# Altium footprint library InverterPCBLib.PcbLib: 74 footprints (part 3 of 5)
Each footprint in its own frame and in the unit in brackets; x right, y up, seen from the top. Pads: shape width x height; smd on the part's side, far side on the other; paste and mask are expansions set on the pad; w line width, h text height; cw(c..) or ccw(c..) is an arc to the next point about the centre after c.
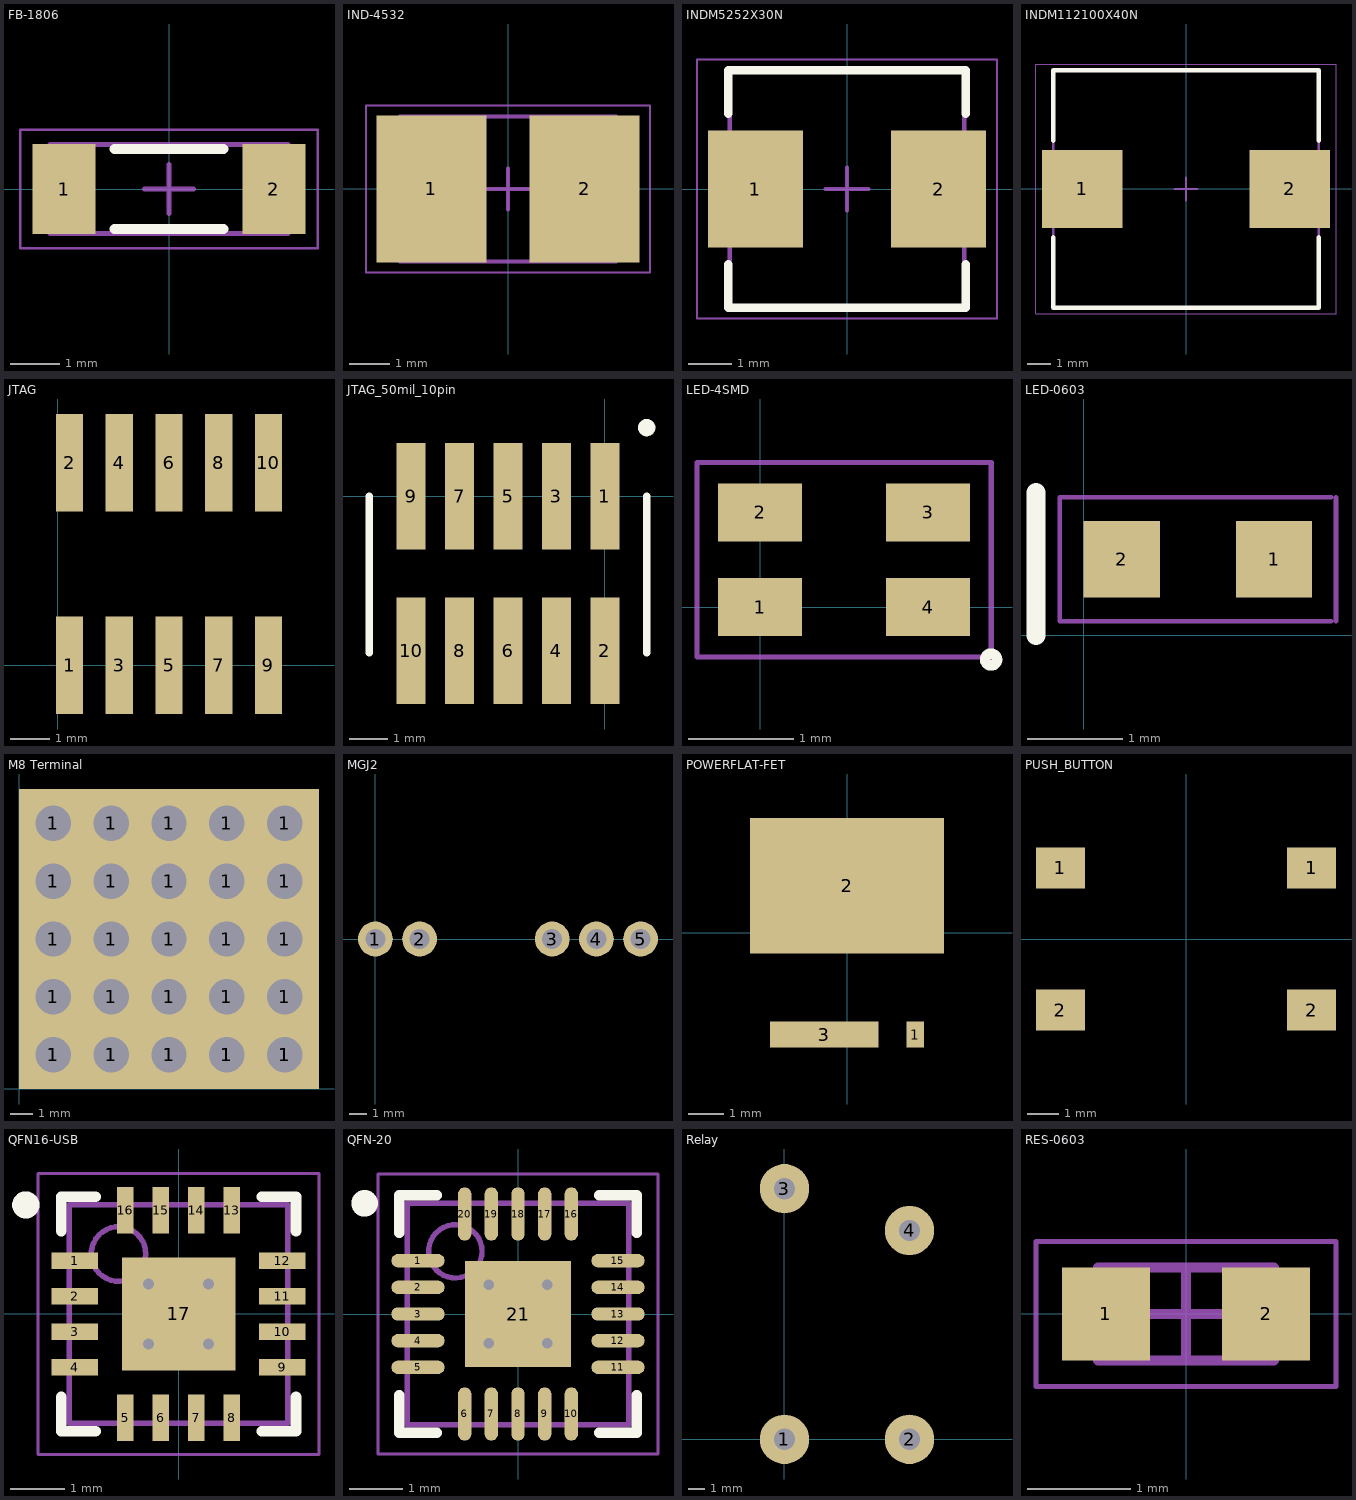
[diagram p2: the footprints below, top view; thin cyan lines are the x and y axes]

## FB-1806 [mm] "Chip Inductor, 2-Leads, Body 4.50x1.60mm, IPC Medium Density"
height 1.3
pads (2):
  rect 1.27x1.82 smd: 1(-2.12,0) 2(2.12,0)
Top Overlay:
  lines w0.2: -1.1,-0.81 1.1,-0.81 ; -1.1,0.81 1.1,0.81
Mechanical 13:
  lines w0.1: -2.4,-0.9 -2.4,0.9 2.4,0.9 2.4,-0.9 -2.4,-0.9
Mechanical 15:
  lines w0.05: -3,-1.2 -3,1.2 3,1.2 3,-1.2 -3,-1.2
  lines w0.1: -0.5,0 0.5,0 ; 0,-0.5 0,0.5
3D body "INDC4516X13N.step": height 1.3, standoff 0, extent -2.4,-0.9 2.4,0.9

## IND-4532 [mm] "Precision Wire Wound Inductor, 2-Leads, Body 5.05x3.50mm, IPC Medium Density"
height 2.6
pads (2):
  rect 2.7x3.6 smd: 1(-1.875,0) 2(1.875,0)
Mechanical 13:
  lines w0.1: -2.65,-1.775 -2.65,1.775 2.65,1.775 2.65,-1.775 -2.65,-1.775
Mechanical 15:
  lines w0.05: -3.475,-2.05 -3.475,2.05 3.475,2.05 3.475,-2.05 -3.475,-2.05
  lines w0.1: -0.5,0 0.5,0 ; 0,-0.5 0,0.5
3D body "INDP5035X26N.step": height 2.7, standoff 0, extent -2.625,-1.75 2.625,1.75

## INDM5252X30N [mm] "Molded Inductor, 2-Leads, Body 5.19x5.19mm, IPC Medium Density"
height 3
pads (2):
  rect 2.2x2.7 smd: 1(-2.125,0) 2(2.125,0)
Top Overlay:
  lines w0.2: -2.75,-1.75 -2.75,-2.75 2.75,-2.75 2.75,-1.75 ; -2.75,1.75 -2.75,2.75 2.75,2.75 2.75,1.75
Mechanical 13:
  lines w0.1: -2.715,-2.715 2.715,-2.715 2.715,2.715 -2.715,2.715 -2.715,-2.715
Mechanical 15:
  lines w0.05: -3.475,-3 3.475,-3 3.475,3 -3.475,3 -3.475,-3
  lines w0.1: -0.5,0 0.5,0 ; 0,-0.5 0,0.5
3D body "INDM5252X30N.step": height 3, standoff 0, extent -2.935,-2.715 2.935,2.715

## INDM112100X40N [mm] "Molded Inductor, 2-Leads, Body 11.15x10.00mm, IPC Medium Density"
height 4
pads (2):
  rect 3.5x3.4 smd: 1(-4.5,0) 2(4.5,0)
Top Overlay:
  lines w0.2: -5.75,-2.1 -5.75,-5.15 5.75,-5.15 5.75,-2.1 ; -5.75,2.1 -5.75,5.15 5.75,5.15 5.75,2.1
Mechanical 13:
  lines w0.1: -5.75,-5.15 5.75,-5.15 5.75,5.15 -5.75,5.15 -5.75,-5.15
Mechanical 15:
  lines w0.05: -6.5,-5.4 6.5,-5.4 6.5,5.4 -6.5,5.4 -6.5,-5.4
  lines w0.1: -0.5,0 0.5,0 ; 0,-0.5 0,0.5
3D body "INDM112100X40N.step": height 4, standoff 0, extent -5.97,-5.15 5.97,5.15

## JTAG [mm]
pads (10):
  rect 0.7x2.5 smd: 1(0.3,0) 2(0.3,5.205) 3(1.577,0) 4(1.577,5.205) 5(2.855,0) 6(2.855,5.205) 7(4.132,0) 8(4.132,5.205) 9(5.41,0) 10(5.41,5.205)
3D body "FTSH-105-01-F-DV-K-TR--3DModel-STEP-56544.STEP": height 6.11, standoff -0.01, extent -0.31,-0.321 6.04,5.521

## JTAG_50mil_10pin [mil]
pads (10):
  rect 30x110 smd: 1(0,0) 2(0,-159.84) 3(-50,0) 4(-50,-159.84) 5(-100,0) 6(-100,-159.84) 7(-150,0) 8(-150,-159.84) 9(-200,0) 10(-200,-159.84)
Top Overlay:
  circle w10: c43.31,70.87 r3.94
  lines w7.87: -243.31,-161.42 -243.31,0 ; 43.31,-161.42 43.31,0
3D body "FTSH-105-01-L-DV-K-TR.stp": height 240.75, standoff -0.25, extent -223.42,-193.74 26.57,36.26

## LED-4SMD [mm]
pads (4):
  rect 0.8x0.55 smd: 1(0,0) 2(0,0.9) 3(1.6,0.9) 4(1.6,0)
Top Overlay:
  circle w0.1: c2.2,-0.5 r0.056
Mechanical 15:
  lines w0.05: -0.6,-0.475 2.2,-0.475 2.2,1.375 -0.6,1.375 -0.6,-0.475
3D body "150060AS75000_STP_150060xS75000_rev1.stp": height 0.7, standoff 0, extent 0,0.375 1.6,1.175
3D body "150060AS75000_STP_150060xS75000_rev1.stp": height 0.7, standoff 0, extent 0,-0.25 1.6,0.55

## LED-0603 [mm]
pads (2):
  rect 0.8x0.8 smd: 1(2,0.8) 2(0.4,0.8)
Top Overlay:
  lines w0.2: -0.5,0 -0.5,1.5
Mechanical 15:
  lines w0.05: 2.6,0.15 -0.25,0.15 -0.25,1.45 2.6,1.45 ; 2.65,0.15 2.65,1.45
3D body "150060AS75000_STP_150060xS75000_rev1.stp": height 0.7, standoff 0, extent 0.4,0.4 2,1.2

## M8 Terminal [mm]
pads (30):
  rect 3x3 hole 1.55 square unplated: 1(1.5,1.5) 1(1.5,1.5) 1(1.5,4.04) 1(1.5,6.58) 1(1.5,9.12) 1(1.5,11.66) 1(4.04,1.5) 1(4.04,1.5) 1(4.04,4.04) 1(4.04,6.58) 1(4.04,9.12) 1(4.04,11.66) 1(6.58,1.5) 1(6.58,1.5) 1(6.58,4.04) 1(6.58,6.58) 1(6.58,9.12) 1(6.58,11.66) 1(9.12,1.5) 1(9.12,1.5) 1(9.12,4.04) 1(9.12,6.58) 1(9.12,9.12) 1(9.12,11.66) 1(11.66,1.5) 1(11.66,1.5) 1(11.66,4.04) 1(11.66,6.58) 1(11.66,9.12) 1(11.66,11.66)
3D body "M8_ScrewTerminal.STEP": height 53, standoff -3.5, extent 0.075,0.075 13.075,13.075

## MGJ2 [mm]
pads (5):
  round 2 hole 1.15 unplated: 1(0,0) 2(2.54,0) 3(10.16,0) 4(12.7,0) 5(15.24,0)
3D body "mps_dcdc_mgj2d_sc_a.step": height 12.6, standoff -4, extent -2.28,-7.32 17.22,2.5

## POWERFLAT-FET [mm]
pads (3):
  rect 0.5x0.73 smd: 1(1.905,-2.835)
  rect 5.4x3.77 smd: 2(0,1.315)
  rect 3.04x0.73 smd: 3(-0.635,-2.835)
3D body: height 1, standoff 0, extent -2.575,-3.075 2.575,3.05

## PUSH_BUTTON [mm]
pads (4):
  rect 1.55x1.3 smd: 1(-3.975,2.25) 1(3.975,2.25) 2(-3.975,-2.25) 2(3.975,-2.25)
3D body "push button.stp": height 4.3, standoff 0, extent -4.5,-3 4.5,3

## QFN16-USB [mm] "QFN, 16-Leads, Body 4.00x4.00mm, Pitch 0.65mm, Thermal Pad 2.08x2.08mm, IPC Medium Density"
height 0.8
pads (17):
  rect 0.85x0.3 smd: 1(-1.9,0.975) 2(-1.9,0.325) 3(-1.9,-0.325) 4(-1.9,-0.975) 9(1.9,-0.975) 10(1.9,-0.325) 11(1.9,0.325) 12(1.9,0.975)
  rect 0.3x0.85 smd: 5(-0.975,-1.9) 6(-0.325,-1.9) 7(0.325,-1.9) 8(0.975,-1.9) 13(0.975,1.9) 14(0.325,1.9) 15(-0.325,1.9) 16(-0.975,1.9)
  rect 2.08x2.08 smd: 17(0,0)
via -0.55,0.55 diameter 0.5 hole 0.2
via 0.55,0.55 diameter 0.5 hole 0.2
via -0.55,-0.55 diameter 0.5 hole 0.2
via 0.55,-0.55 diameter 0.5 hole 0.2
Top Overlay:
  circle w0.25: c-2.8,2 r0.125
  lines w0.2: -2.15,-1.525 -2.15,-2.15 -1.525,-2.15 ; -2.15,1.525 -2.15,2.15 -1.525,2.15 ; 1.525,-2.15 2.15,-2.15 2.15,-1.525 ; 1.525,2.15 2.15,2.15 2.15,1.525
Mechanical 13:
  circle w0.1: c-1.1,1.1 r0.5
  lines w0.1: -2,-2 -2,2 2,2 2,-2 -2,-2
Mechanical 15:
  lines w0.05: -2.575,-2.575 -2.575,2.575 2.575,2.575 2.575,-2.575 -2.575,-2.575
  lines w0.1: -0.5,0 0.5,0 ; 0,-0.5 0,0.5
3D body "QFN65P400X400X80_HS-17N.step": height 0.8, standoff 0, extent -2.05,-2.05 2.05,2.05

## QFN-20 [mm] "QFN, 20-Leads, Body 4.00x4.00mm, Pitch 0.50mm, Thermal Pad 1.98x1.98mm, IPC Medium Density"
height 0.8
pads (21):
  oval 1x0.25 smd: 1(-1.875,1) 2(-1.875,0.5) 3(-1.875,0) 4(-1.875,-0.5) 5(-1.875,-1) 11(1.875,-1) 12(1.875,-0.5) 13(1.875,0) 14(1.875,0.5) 15(1.875,1)
  oval 0.25x1 smd: 6(-1,-1.875) 7(-0.5,-1.875) 8(0,-1.875) 9(0.5,-1.875) 10(1,-1.875) 16(1,1.875) 17(0.5,1.875) 18(0,1.875) 19(-0.5,1.875) 20(-1,1.875)
  rect 1.98x1.98 smd: 21(0,0)
via 0.55,-0.55 diameter 0.5 hole 0.2
via -0.55,-0.55 diameter 0.5 hole 0.2
via 0.55,0.55 diameter 0.5 hole 0.2
via -0.55,0.55 diameter 0.5 hole 0.2
Top Overlay:
  circle w0.25: c-2.875,2.075 r0.125
  lines w0.2: -2.225,-1.525 -2.225,-2.225 -1.525,-2.225 ; -2.225,1.525 -2.225,2.225 -1.525,2.225 ; 1.525,-2.225 2.225,-2.225 2.225,-1.525 ; 1.525,2.225 2.225,2.225 2.225,1.525
Mechanical 13:
  circle w0.1: c-1.175,1.175 r0.5
  lines w0.1: -2.075,-2.075 2.075,-2.075 2.075,2.075 -2.075,2.075 -2.075,-2.075
Mechanical 15:
  lines w0.05: -2.625,-2.625 2.625,-2.625 2.625,2.625 -2.625,2.625 -2.625,-2.625
  lines w0.1: -0.5,0 0.5,0 ; 0,-0.5 0,0.5
3D body "QFN50P400X400X80_HS-21N.step": height 0.8, standoff 0, extent -2.155,-2.155 2.155,2.155

## Relay [mm]
pads (4):
  round 3 hole 1.3 unplated: 1(0,0) 2(7.6,0) 3(0,15.24) 4(7.6,12.7)
3D body "c-1461400-4-c3-3d.stp": height 14.9, standoff -3.8, extent -1.3,-1.2 8.9,17

## RES-0603 [mm] "Chip Resistor, 2-Leads, Body 1.60x0.80mm, IPC Medium Density"
height 0.55
pads (2):
  rect 0.85x0.9 smd: 1(-0.775,0) 2(0.775,0)
Mechanical 13:
  lines w0.1: -0.85,-0.45 0.85,-0.45 0.85,0.45 -0.85,0.45 -0.85,-0.45
Mechanical 15:
  lines w0.05: -1.45,-0.7 1.45,-0.7 1.45,0.7 -1.45,0.7 -1.45,-0.7
  lines w0.1: -0.45,0 0.45,0 ; 0,-0.45 0,0.45
3D body "RESC1608X06N.step": height 0.55, standoff 0, extent -0.85,-0.45 0.85,0.45